# Altium footprint library TIDA_00620.PcbLib: 53 footprints (part 4 of 4)
Each footprint in its own frame and in the unit in brackets; x right, y up, seen from the top. Pads: shape width x height; smd on the part's side, far side on the other; paste and mask are expansions set on the pad; w line width, h text height; cw(c..) or ccw(c..) is an arc to the next point about the centre after c.
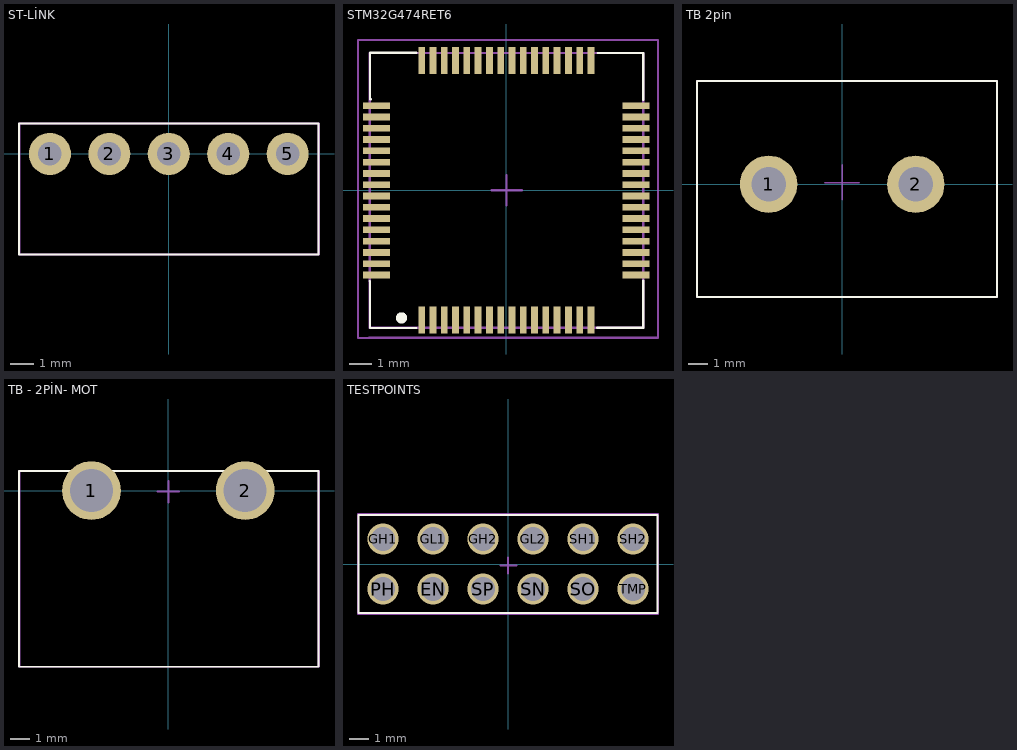
[diagram p3: the footprints below, top view; thin cyan lines are the x and y axes]

## ST-LİNK [mm]
pads (5):
  round 1.8 hole 1 mask+0.05: 1(-5.08,0) 2(-2.54,0) 3(0,0) 4(2.54,0) 5(5.08,0)
Top Overlay:
  lines w0.1: -6.4,-4.3 6.4,-4.3 6.4,1.3 -6.4,1.3 -6.4,-4.3
Top 3D Body:
  lines w0.1: -6.38,-4.3 6.42,-4.3 6.42,1.3 -6.28,1.3 -6.38,1.3 -6.38,-4.3
Top Component Center:
  lines w0.1: -0.6,0 0.6,0 ; -0.034,1.3 -6.4,1.3 ; 0,-0.6 0,0.6 ; -6.4,1.3 6.4,1.3 6.4,-4.3 -6.4,-4.3 -6.4,1.3
Top Designator:
  text ".Designator" at 3.493,-2.281 h0.5
3D body "1x5 Male Pin Header Angle.STEP": height 5.32, standoff -7.04, extent -6.31,-4.25 6.395,1.25

## STM32G474RET6 [mm]
pads (64):
  rect 0.3x1.2 smd mask+0.05: 1(-3.75,-5.75) 2(-3.25,-5.75) 3(-2.75,-5.75) 4(-2.25,-5.75) 5(-1.75,-5.75) 6(-1.25,-5.75) 7(-0.75,-5.75) 8(-0.25,-5.75) 9(0.25,-5.75) 10(0.75,-5.75) 11(1.25,-5.75) 12(1.75,-5.75) 13(2.25,-5.75) 14(2.75,-5.75) 15(3.25,-5.75) 16(3.75,-5.75) 33(3.75,5.75) 34(3.25,5.75) 35(2.75,5.75) 36(2.25,5.75) 37(1.75,5.75) 38(1.25,5.75) 39(0.75,5.75) 40(0.25,5.75) 41(-0.25,5.75) 42(-0.75,5.75) 43(-1.25,5.75) 44(-1.75,5.75) 45(-2.25,5.75) 46(-2.75,5.75) 47(-3.25,5.75) 48(-3.75,5.75)
  rect 1.2x0.3 smd mask+0.05: 17(5.75,-3.75) 18(5.75,-3.25) 19(5.75,-2.75) 20(5.75,-2.25) 21(5.75,-1.75) 22(5.75,-1.25) 23(5.75,-0.75) 24(5.75,-0.25) 25(5.75,0.25) 26(5.75,0.75) 27(5.75,1.25) 28(5.75,1.75) 29(5.75,2.25) 30(5.75,2.75) 31(5.75,3.25) 32(5.75,3.75) 49(-5.75,3.75) 50(-5.75,3.25) 51(-5.75,2.75) 52(-5.75,2.25) 53(-5.75,1.75) 54(-5.75,1.25) 55(-5.75,0.75) 56(-5.75,0.25) 57(-5.75,-0.25) 58(-5.75,-0.75) 59(-5.75,-1.25) 60(-5.75,-1.75) 61(-5.75,-2.25) 62(-5.75,-2.75) 63(-5.75,-3.25) 64(-5.75,-3.75)
Top Overlay:
  circle w0.3: c-4.64,-5.65 r0.1
  lines w0.1: -6.06,-4.02 -6.04,-4.02 -6.04,-6.1 -3.99,-6.1 ; -5.99,4.04 -6.04,4.04 -6.04,6.1 -3.99,6.1 ; 4.02,-6.09 6.07,-6.09 6.07,-4 ; 4.04,6.09 6.07,6.09 6.07,4.01 6.08,4.01
Top 3D Body:
  lines w0.1: -6.05,-6.09 -6.05,6.08 6,6.08 6.07,6.08 6.07,-6.09 -6.05,-6.09
Top Component Center:
  lines w0.1: -0.66,0.01 0.68,0.01 ; 0.01,-0.66 0.01,0.68 ; -6.57,-6.54 -6.07,-6.54 -6.07,-6.53 6.72,-6.53 6.72,6.66 -6.57,6.66 -6.57,-6.54
Top Designator:
  text ".Designator" at 3.203,-0.627 h0.5
3D body "STM32G474RET6.STEP": height 1.6, standoff 0, extent -5.99,-6.01 6.01,5.99

## TB 2pin [mm]
pads (2):
  round 3 hole 1.8 mask+0.05: 1(-3.85,0) 2(3.85,0)
Top Overlay:
  lines w0.1: -7.6,-5.9 -7.6,5.4 8.1,5.4 8.1,-5.9 -7.6,-5.9
Top 3D Body:
  lines w0.1: -7.6,-5.9 -7.6,5.4 -7.5,5.4 8.1,5.4 8.1,-5.9 -7.6,-5.9
Top Component Center:
  lines w0.1: -0.911,0.075 0.889,0.075 ; 0,-0.8 0,1 ; -7.6,-5.9 -7.6,5.4 8.1,5.4 8.1,-5.9 -7.6,-5.9
Top Designator:
  text ".Designator" at 3.103,-0.327 h0.5
3D body "Download_STP_691253910002+%28rev1%29.stp": height 18, standoff -4, extent -7.533,-5.869 8.067,5.331

## TB - 2PİN- MOT [mm]
pads (2):
  round 3 hole 2.2 mask+0.05: 1(-3.929,0) 2(3.929,0)
Top Overlay:
  lines w0.1: -7.629,-9 -7.629,1 7.671,1 7.671,-9 -7.629,-9
Top 3D Body:
  lines w0.1: -7.629,-9 -7.629,1 7.671,1 7.671,-9 -7.629,-9
Top Component Center:
  lines w0.1: -0.55,-0.05 0.55,-0.05 ; 0,-0.6 0,0.5 ; -7.6,-9 -7.6,1 7.7,1 7.7,-9 -7.6,-9
Top Designator:
  text ".Designator" at 3.265,-3.958 h0.5
3D body "BR-76231M-02.stp": height 10.4, standoff -4, extent -7.639,-9 7.601,1

## TESTPOINTS [mm]
pads (12):
  round 1.6 hole 1.2 mask+0.05: EN(-3.81,-1.27) GH1(-6.35,1.27) GH2(-1.27,1.27) GL1(-3.81,1.27) GL2(1.27,1.27) PH(-6.35,-1.27) SH1(3.81,1.27) SH2(6.35,1.27) SN(1.27,-1.27) SO(3.81,-1.27) SP(-1.27,-1.27) TMP(6.35,-1.27)
Top Overlay:
  lines w0.1: -7.6,-2.5 -7.6,2.5 7.6,2.5 7.6,-2.5 -7.6,-2.5
Top 3D Body:
  lines w0.1: -7.62,-2.54 7.62,-2.54 7.62,2.54 -7.62,2.54 -7.62,-2.54
Top Component Center:
  lines w0.1: -0.392,-0.086 0.438,-0.086 ; -0.01,0.34 0.01,0.34 0.01,-0.49 0,-0.49 ; -7.62,-2.54 -7.62,2.54 7.62,2.54 7.62,-2.54 -7.62,-2.54
Top Designator:
  text ".Designator" at 4.381,-0.277 h0.5
3D body "User Library-Test Point Keystone - 5001 BLACK.STEP": height 4.56, standoff -3.05, extent -7.62,-2.531 -5.08,-0.009
3D body "User Library-Test Point Keystone - 5001 BLACK.STEP": height 4.56, standoff -3.05, extent -5.08,-2.531 -2.54,-0.009
3D body "User Library-Test Point Keystone - 5001 BLACK.STEP": height 4.56, standoff -3.05, extent -2.54,-2.531 0,-0.009
3D body "User Library-Test Point Keystone - 5001 BLACK.STEP": height 4.56, standoff -3.05, extent 0,-2.531 2.54,-0.009
3D body "User Library-Test Point Keystone - 5001 BLACK.STEP": height 4.56, standoff -3.05, extent 2.54,-2.531 5.08,-0.009
3D body "User Library-Test Point Keystone - 5001 BLACK.STEP": height 4.56, standoff -3.05, extent 5.08,-2.531 7.62,-0.009
3D body "User Library-Test Point Keystone - 5001 BLACK.STEP": height 4.56, standoff -3.05, extent -7.62,0.009 -5.08,2.531
3D body "User Library-Test Point Keystone - 5001 BLACK.STEP": height 4.56, standoff -3.05, extent -5.08,0.009 -2.54,2.531
3D body "User Library-Test Point Keystone - 5001 BLACK.STEP": height 4.56, standoff -3.05, extent -2.54,0.009 0,2.531
3D body "User Library-Test Point Keystone - 5001 BLACK.STEP": height 4.56, standoff -3.05, extent 0,0.009 2.54,2.531
3D body "User Library-Test Point Keystone - 5001 BLACK.STEP": height 4.56, standoff -3.05, extent 2.54,0.009 5.08,2.531
3D body "User Library-Test Point Keystone - 5001 BLACK.STEP": height 4.56, standoff -3.05, extent 5.08,0.009 7.62,2.531